# Altium footprint library 7-Connectors-7.PcbLib: 35 footprints (part 3 of 4) (continued)
## PANASONIC_AYF312315 [mm] "23 Contacts, Pitch 0.3mm, Surface Mount, FPC for FPC Connection, YF31 Serie" (continued)
Mechanical 14:
  lines w0.1: -4.125,-1.1 -4.125,-1.15 -3.825,-1.15 -3.825,-1.6 3.825,-1.6 3.825,-1.15 4.125,-1.15 4.125,-1.1 ; -4.075,-1.15 -4.075,-1.25 -3.925,-1.25 -3.925,-1.15 ; -3.91,-1.15 -3.91,-1.17 ; -3.91,-0.151 -3.825,-0.151 -3.825,-0.129 ; -3.91,-0.15 -3.825,-0.15 ; -3.91,-0.13 -3.825,-0.13 ; -3.91,-0.05 3.91,-0.05 ; -3.91,0.35 3.91,0.35 ; -3.825,-1.385 -3.91,-1.3 ; -3.825,-1.3 -3.91,-1.3 ; -3.825,-1.17 -3.91,-1.17 ; -3.825,-0.05 -3.825,-0.129 ; -3.36,-0.129 -3.825,-0.129 ; -3.36,-0.05 -3.36,-0.283 -3.24,-0.283 -3.24,-0.05 ; -3.24,-0.129 -3.06,-0.129 ; -3.06,-0.05 -3.06,-0.332 -2.94,-0.332 -2.94,-0.05 ; -2.94,-0.129 -2.76,-0.129 ; -2.76,-0.05 -2.76,-0.283 -2.64,-0.283 -2.64,-0.05 ; -2.64,-0.129 -2.46,-0.129 ; -2.46,-0.05 -2.46,-0.332 -2.34,-0.332 -2.34,-0.05 ; -2.34,-0.129 -2.16,-0.129 ; -2.16,-0.05 -2.16,-0.283 -2.04,-0.283 -2.04,-0.05 ; -2.04,-0.129 -1.86,-0.129 ; -1.86,-0.05 -1.86,-0.332 -1.74,-0.332 -1.74,-0.05 ; -1.74,-0.129 -1.56,-0.129 ; -1.56,-0.05 -1.56,-0.283 -1.44,-0.283 -1.44,-0.05 ; -1.44,-0.129 -1.26,-0.129 ; -1.26,-0.05 -1.26,-0.332 -1.14,-0.332 -1.14,-0.05 ; -1.14,-0.129 -0.96,-0.129 ; -0.96,-0.05 -0.96,-0.283 -0.84,-0.283 -0.84,-0.05 ; -0.84,-0.129 -0.66,-0.129 ; -0.66,-0.05 -0.66,-0.332 -0.54,-0.332 -0.54,-0.05 ; -0.54,-0.129 -0.36,-0.129 ; -0.36,-0.05 -0.36,-0.283 -0.24,-0.283 -0.24,-0.05 ; -0.24,-0.129 -0.06,-0.129 ; -0.06,-0.05 -0.06,-0.332 0.06,-0.332 0.06,-0.05 ; 0.06,-0.129 0.24,-0.129 ; 0.24,-0.05 0.24,-0.283 0.36,-0.283 0.36,-0.05 ; 0.36,-0.129 0.54,-0.129 ; 0.54,-0.05 0.54,-0.332 0.66,-0.332 0.66,-0.05 ; 0.66,-0.129 0.84,-0.129 ; 0.84,-0.05 0.84,-0.283 0.96,-0.283 0.96,-0.05 ; 0.96,-0.129 1.14,-0.129 ; 1.14,-0.05 1.14,-0.332 1.26,-0.332 1.26,-0.05 ; 1.26,-0.129 1.44,-0.129 ; 1.44,-0.05 1.44,-0.283 1.56,-0.283 1.56,-0.05 ; 1.56,-0.129 1.74,-0.129 ; 1.74,-0.05 1.74,-0.332 1.86,-0.332 1.86,-0.05 ; 1.86,-0.129 2.04,-0.129 ; 2.04,-0.05 2.04,-0.283 2.16,-0.283 2.16,-0.05 ; 2.16,-0.129 2.34,-0.129 ; 2.34,-0.05 2.34,-0.332 2.46,-0.332 2.46,-0.05 ; 2.46,-0.129 2.64,-0.129 ; 2.64,-0.05 2.64,-0.283 2.76,-0.283 2.76,-0.05 ; 2.76,-0.129 2.94,-0.129 ; 2.94,-0.05 2.94,-0.332 3.06,-0.332 3.06,-0.05 ; 3.06,-0.129 3.24,-0.129 ; 3.24,-0.05 3.24,-0.283 3.36,-0.283 3.36,-0.05 ; 3.36,-0.129 3.825,-0.129 ; 3.825,-1.385 3.91,-1.3 ; 3.825,-1.3 3.91,-1.3 ; 3.825,-1.17 3.91,-1.17 ; 3.825,-0.15 3.91,-0.15 ; 3.825,-0.13 3.91,-0.13 ; 3.825,-0.05 3.825,-0.129 ; 3.91,-1.15 3.91,-1.17 ; 3.91,-0.151 3.825,-0.151 3.825,-0.129 ; 3.925,-1.15 3.925,-1.25 4.075,-1.25 4.075,-1.15 ; -3.91,-1.3 -3.91,-1.17 ; 3.91,-1.3 3.91,-1.17 ; -4.475,-1.1 -4.475,1.6 4.475,1.6 4.475,-1.1 3.91,-1.1 3.91,0.38 -3.91,0.38 -3.91,-1.1 -4.475,-1.1
Mechanical 15:
  lines w0.05: -4.725,-1.85 -4.725,1.95 4.725,1.95 4.725,-1.85 -4.725,-1.85
3D body "p065-030.stp": height 0.02, standoff 0, extent 2.85,1.125 3.15,1.775
3D body "p065-030.stp": height 0.02, standoff 0, extent 2.25,1.125 2.55,1.775
3D body "p065-030.stp": height 0.02, standoff 0, extent 1.65,1.125 1.95,1.775
3D body "p065-030.stp": height 0.02, standoff 0, extent 1.05,1.125 1.35,1.775
3D body "p065-030.stp": height 0.02, standoff 0, extent 0.45,1.125 0.75,1.775
3D body "p065-030.stp": height 0.02, standoff 0, extent -0.15,1.125 0.15,1.775
3D body "p065-030.stp": height 0.02, standoff 0, extent -0.75,1.125 -0.45,1.775
3D body "p065-030.stp": height 0.02, standoff 0, extent -1.35,1.125 -1.05,1.775
3D body "p065-030.stp": height 0.02, standoff 0, extent -1.95,1.125 -1.65,1.775
3D body "p065-030.stp": height 0.02, standoff 0, extent -2.55,1.125 -2.25,1.775
3D body "p065-030.stp": height 0.02, standoff 0, extent -3.15,1.125 -2.85,1.775
3D body "p100-045.stp": height 0.02, standoff 0, extent 3.775,-1.4 4.225,-0.4
3D body "p100-045.stp": height 0.02, standoff 0, extent -4.225,-1.4 -3.775,-0.4
3D body "PANASONIC_AYF312315.stp": height 0.9, standoff 0, extent -4.475,-1.6 4.475,1.6

## PANASONIC_AYF312715 [mm] "27 Contacts, Pitch 0.3mm, Surface Mount, FPC for FPC Connection, YF31 Serie"
height 0.91
pads (29):
  rect 0.3x0.7 smd: 1(-3.9,-1.15) 3(-3.3,-1.15) 5(-2.7,-1.15) 7(-2.1,-1.15) 9(-1.5,-1.15) 11(-0.9,-1.15) 13(-0.3,-1.15) 15(0.3,-1.15) 17(0.9,-1.15) 19(1.5,-1.15) 21(2.1,-1.15) 23(2.7,-1.15) 25(3.3,-1.15) 27(3.9,-1.15)
  rect 0.3x0.5 smd: 2(-3.6,1.45) 4(-3,1.45) 6(-2.4,1.45) 8(-1.8,1.45) 10(-1.2,1.45) 12(-0.6,1.45) 14(0,1.45) 16(0.6,1.45) 18(1.2,1.45) 20(1.8,1.45) 22(2.4,1.45) 24(3,1.45) 26(3.6,1.45)
  rect 0.45x1 smd: 52(4.6,-0.9) 53(-4.6,-0.9)
Top Overlay:
  circle w0.25: c-3.9,-2.1 r0.125
  lines w0.2: -5.075,-0.05 -5.075,1.6 -4.15,1.6 ; -4.51,0.35 4.51,0.35 ; -4.425,-0.05 -4.425,-0.129 -3.96,-0.129 ; -3.96,-0.05 -3.96,-0.283 -3.84,-0.283 -3.84,-0.05 ; -3.84,-0.129 -3.66,-0.129 ; -3.66,-0.05 -3.66,-0.332 -3.54,-0.332 -3.54,-0.05 ; -3.36,-0.05 -3.36,-0.283 -3.24,-0.283 -3.24,-0.05 ; -3.24,-0.129 -3.06,-0.129 -3.225,-0.129 ; -3.06,-0.05 -3.06,-0.332 -2.94,-0.332 -2.94,-0.05 ; -2.94,-0.129 -2.76,-0.129 ; -2.76,-0.05 -2.76,-0.283 -2.64,-0.283 -2.64,-0.05 ; -2.64,-0.129 -2.46,-0.129 ; -2.46,-0.05 -2.46,-0.332 -2.34,-0.332 -2.34,-0.05 ; -2.34,-0.129 -2.16,-0.129 ; -2.16,-0.05 -2.16,-0.283 -2.04,-0.283 -2.04,-0.05 ; -2.04,-0.129 -1.86,-0.129 ; -1.86,-0.05 -1.86,-0.332 -1.74,-0.332 -1.74,-0.05 ; -1.74,-0.129 -1.56,-0.129 ; -1.56,-0.05 -1.56,-0.283 -1.44,-0.283 -1.44,-0.05 ; -1.44,-0.129 -1.26,-0.129 ; -1.26,-0.05 -1.26,-0.332 -1.14,-0.332 -1.14,-0.05 ; -1.14,-0.129 -0.96,-0.129 ; -0.96,-0.05 -0.96,-0.283 -0.84,-0.283 -0.84,-0.05 ; -0.84,-0.129 -0.66,-0.129 ; -0.66,-0.05 -0.66,-0.332 -0.54,-0.332 -0.54,-0.05 ; -0.54,-0.129 -0.36,-0.129 ; -0.36,-0.05 -0.36,-0.283 -0.24,-0.283 -0.24,-0.05 ; -0.24,-0.129 -0.06,-0.129 ; -0.06,-0.05 -0.06,-0.332 0.06,-0.332 0.06,-0.05 ; 0.06,-0.129 0.24,-0.129 ; 0.24,-0.05 0.24,-0.283 0.36,-0.283 0.36,-0.05 ; 0.36,-0.129 0.54,-0.129 ; 0.54,-0.05 0.54,-0.332 0.66,-0.332 0.66,-0.05 ; 0.66,-0.129 0.84,-0.129 ; 0.84,-0.05 0.84,-0.283 0.96,-0.283 0.96,-0.05 ; 0.96,-0.129 1.14,-0.129 ; 1.14,-0.05 1.14,-0.332 1.26,-0.332 1.26,-0.05 ; 1.26,-0.129 1.44,-0.129 ; 1.44,-0.05 1.44,-0.283 1.56,-0.283 1.56,-0.05 ; 1.56,-0.129 1.74,-0.129 ; 1.74,-0.05 1.74,-0.332 1.86,-0.332 1.86,-0.05 ; 1.86,-0.129 2.04,-0.129 ; 2.04,-0.05 2.04,-0.283 2.16,-0.283 2.16,-0.05 ; 2.16,-0.129 2.34,-0.129 ; 2.34,-0.05 2.34,-0.332 2.46,-0.332 2.46,-0.05 ; 2.46,-0.129 2.64,-0.129 ; 2.64,-0.05 2.64,-0.283 2.76,-0.283 2.76,-0.05 ; 2.76,-0.129 2.94,-0.129 ; 2.94,-0.05 2.94,-0.332 3.06,-0.332 3.06,-0.05 ; 3.06,-0.129 3.24,-0.129 ; 3.24,-0.05 3.24,-0.283 3.36,-0.283 3.36,-0.05 ; 3.36,-0.129 3.54,-0.129 ; 3.54,-0.05 3.54,-0.332 3.66,-0.332 3.66,-0.05 ; 3.66,-0.129 3.84,-0.129 ; 3.84,-0.05 3.84,-0.283 3.96,-0.283 3.96,-0.05 ; 3.96,-0.129 4.425,-0.129 4.425,-0.05 ; 4.15,1.6 5.075,1.6 5.075,-0.05 ; -4.51,-0.05 -4.51,0.38 4.51,0.38 4.51,-0.05 -4.51,-0.05
Mechanical 8:
  drawing of 151 lines, arcs and shapes, not listed
Mechanical 14:
  drawing of 154 lines, arcs and shapes, not listed
Mechanical 15:
  lines w0.05: -5.325,-1.85 5.325,-1.85 5.325,1.95 -5.325,1.95 -5.325,-1.85
3D body "p100-045.stp": height 0.02, standoff 0, extent 4.375,-1.4 4.825,-0.4
3D body "p100-045.stp": height 0.02, standoff 0, extent -4.825,-1.4 -4.375,-0.4
3D body "p065-030.stp": height 0.02, standoff 0, extent 3.45,1.125 3.75,1.775
3D body "p065-030.stp": height 0.02, standoff 0, extent 2.85,1.125 3.15,1.775
3D body "p065-030.stp": height 0.02, standoff 0, extent 2.25,1.125 2.55,1.775
3D body "p065-030.stp": height 0.02, standoff 0, extent 1.65,1.125 1.95,1.775
3D body "p065-030.stp": height 0.02, standoff 0, extent 1.05,1.125 1.35,1.775
3D body "p065-030.stp": height 0.02, standoff 0, extent 0.45,1.125 0.75,1.775
3D body "p065-030.stp": height 0.02, standoff 0, extent -0.15,1.125 0.15,1.775
3D body "p065-030.stp": height 0.02, standoff 0, extent -0.75,1.125 -0.45,1.775
3D body "p065-030.stp": height 0.02, standoff 0, extent -1.35,1.125 -1.05,1.775
3D body "p065-030.stp": height 0.02, standoff 0, extent -1.95,1.125 -1.65,1.775
3D body "p065-030.stp": height 0.02, standoff 0, extent -2.55,1.125 -2.25,1.775
3D body "p065-030.stp": height 0.02, standoff 0, extent -3.15,1.125 -2.85,1.775
3D body "p065-030.stp": height 0.02, standoff 0, extent -3.75,1.125 -3.45,1.775
3D body "PANASONIC_AYF312715.stp": height 0.9, standoff 0, extent -5.075,-1.6 5.075,1.6

## PANASONIC_AYF313315 [mm] "33 Contacts, Pitch 0.3mm, Surface Mount, FPC for FPC Connection, YF31 Serie"
height 0.91
pads (35):
  rect 0.3x0.7 smd: 1(-4.8,-1.15) 3(-4.2,-1.15) 5(-3.6,-1.15) 7(-3,-1.15) 9(-2.4,-1.15) 11(-1.8,-1.15) 13(-1.2,-1.15) 15(-0.6,-1.15) 17(0,-1.15) 19(0.6,-1.15) 21(1.2,-1.15) 23(1.8,-1.15) 25(2.4,-1.15) 27(3,-1.15) 29(3.6,-1.15) 31(4.2,-1.15) 33(4.8,-1.15)
  rect 0.3x0.5 smd: 2(-4.5,1.45) 4(-3.9,1.45) 6(-3.3,1.45) 8(-2.7,1.45) 10(-2.1,1.45) 12(-1.5,1.45) 14(-0.9,1.45) 16(-0.3,1.45) 18(0.3,1.45) 20(0.9,1.45) 22(1.5,1.45) 24(2.1,1.45) 26(2.7,1.45) 28(3.3,1.45) 30(3.9,1.45) 32(4.5,1.45)
  rect 0.45x1 smd: 34(5.5,-0.9) 35(-5.5,-0.9)
Top Overlay:
  circle w0.25: c-4.8,-2.1 r0.125
  lines w0.2: -5.975,-0.05 -5.975,1.6 -5.05,1.6 ; -5.41,0.35 5.41,0.35 ; -5.325,-0.05 -5.325,-0.129 -4.86,-0.129 ; -4.86,-0.05 -4.86,-0.283 -4.74,-0.283 -4.74,-0.05 ; -4.74,-0.129 -4.56,-0.129 ; -4.56,-0.05 -4.56,-0.332 -4.44,-0.332 -4.44,-0.05 ; -4.44,-0.129 -4.26,-0.129 ; -4.26,-0.05 -4.26,-0.283 -4.14,-0.283 -4.14,-0.05 ; -4.14,-0.129 -3.96,-0.129 ; -3.96,-0.05 -3.96,-0.332 -3.84,-0.332 -3.84,-0.05 ; -3.84,-0.129 -3.66,-0.129 ; -3.66,-0.05 -3.66,-0.283 -3.54,-0.283 -3.54,-0.05 ; -3.54,-0.129 -3.36,-0.129 ; -3.36,-0.05 -3.36,-0.332 -3.24,-0.332 -3.24,-0.05 ; -3.24,-0.129 -3.06,-0.129 ; -3.06,-0.05 -3.06,-0.283 -2.94,-0.283 -2.94,-0.05 ; -2.94,-0.129 -2.76,-0.129 ; -2.76,-0.05 -2.76,-0.332 -2.64,-0.332 -2.64,-0.05 ; -2.64,-0.129 -2.46,-0.129 ; -2.46,-0.05 -2.46,-0.283 -2.34,-0.283 -2.34,-0.05 ; -2.34,-0.129 -2.16,-0.129 ; -2.16,-0.05 -2.16,-0.332 -2.04,-0.332 -2.04,-0.05 ; -2.04,-0.129 -1.86,-0.129 ; -1.86,-0.05 -1.86,-0.283 -1.74,-0.283 -1.74,-0.05 ; -1.74,-0.129 -1.56,-0.129 ; -1.56,-0.05 -1.56,-0.332 -1.44,-0.332 -1.44,-0.05 ; -1.44,-0.129 -1.26,-0.129 ; -1.26,-0.05 -1.26,-0.283 -1.14,-0.283 -1.14,-0.05 ; -1.14,-0.129 -0.96,-0.129 ; -0.96,-0.05 -0.96,-0.332 -0.84,-0.332 -0.84,-0.05 ; -0.84,-0.129 -0.66,-0.129 ; -0.66,-0.05 -0.66,-0.283 -0.54,-0.283 -0.54,-0.05 ; -0.54,-0.129 -0.36,-0.129 ; -0.36,-0.05 -0.36,-0.332 -0.24,-0.332 -0.24,-0.05 ; -0.24,-0.129 -0.06,-0.129 ; -0.06,-0.05 -0.06,-0.283 0.06,-0.283 0.06,-0.05 ; 0.06,-0.129 0.24,-0.129 ; 0.24,-0.05 0.24,-0.332 0.36,-0.332 0.36,-0.05 ; 0.36,-0.129 0.54,-0.129 ; 0.54,-0.05 0.54,-0.283 0.66,-0.283 0.66,-0.05 ; 0.66,-0.129 0.84,-0.129 ; 0.84,-0.05 0.84,-0.332 0.96,-0.332 0.96,-0.05 ; 0.96,-0.129 1.14,-0.129 ; 1.14,-0.05 1.14,-0.283 1.26,-0.283 1.26,-0.05 ; 1.26,-0.129 1.44,-0.129 ; 1.44,-0.05 1.44,-0.332 1.56,-0.332 1.56,-0.05 ; 1.56,-0.129 1.74,-0.129 ; 1.74,-0.05 1.74,-0.283 1.86,-0.283 1.86,-0.05 ; 1.86,-0.129 2.04,-0.129 ; 2.04,-0.05 2.04,-0.332 2.16,-0.332 2.16,-0.05 ; 2.16,-0.129 2.34,-0.129 ; 2.34,-0.05 2.34,-0.283 2.46,-0.283 2.46,-0.05 ; 2.46,-0.129 2.64,-0.129 ; 2.64,-0.05 2.64,-0.332 2.76,-0.332 2.76,-0.05 ; 2.76,-0.129 2.94,-0.129 ; 2.94,-0.05 2.94,-0.283 3.06,-0.283 3.06,-0.05 ; 3.06,-0.129 3.24,-0.129 ; 3.24,-0.05 3.24,-0.332 3.36,-0.332 3.36,-0.05 ; 3.36,-0.129 3.54,-0.129 ; 3.54,-0.05 3.54,-0.283 3.66,-0.283 3.66,-0.05 ; 3.66,-0.129 3.84,-0.129 ; 3.84,-0.05 3.84,-0.332 3.96,-0.332 3.96,-0.05 ; 3.96,-0.129 4.14,-0.129 ; 4.14,-0.05 4.14,-0.283 4.26,-0.283 4.26,-0.05 ; 4.26,-0.129 4.44,-0.129 ; 4.44,-0.05 4.44,-0.332 4.56,-0.332 4.56,-0.05 ; 4.56,-0.129 4.74,-0.129 ; 4.74,-0.05 4.74,-0.283 4.86,-0.283 4.86,-0.05 ; 4.86,-0.129 5.325,-0.129 5.325,-0.05 ; 5.05,1.6 5.975,1.6 5.975,-0.05 ; -5.41,-0.05 5.41,-0.05 5.41,0.38 -5.41,0.38 -5.41,-0.05
Mechanical 8:
  drawing of 179 lines, arcs and shapes, not listed
Mechanical 14:
  drawing of 176 lines, arcs and shapes, not listed
Mechanical 15:
  lines w0.05: -6.225,-1.85 -6.225,1.95 6.225,1.95 6.225,-1.85 -6.225,-1.85
3D body "PANASONIC_AYF313315.stp": height 0.9, standoff 0, extent -5.975,-1.6 5.975,1.6
3D body "p065-030.stp": height 0.02, standoff 0, extent -4.65,1.125 -4.35,1.775
3D body "p065-030.stp": height 0.02, standoff 0, extent -4.05,1.125 -3.75,1.775
3D body "p065-030.stp": height 0.02, standoff 0, extent -3.45,1.125 -3.15,1.775
3D body "p065-030.stp": height 0.02, standoff 0, extent -2.85,1.125 -2.55,1.775
3D body "p065-030.stp": height 0.02, standoff 0, extent -2.25,1.125 -1.95,1.775
3D body "p065-030.stp": height 0.02, standoff 0, extent -1.65,1.125 -1.35,1.775
3D body "p065-030.stp": height 0.02, standoff 0, extent -1.05,1.125 -0.75,1.775
3D body "p065-030.stp": height 0.02, standoff 0, extent -0.45,1.125 -0.15,1.775
3D body "p065-030.stp": height 0.02, standoff 0, extent 0.15,1.125 0.45,1.775
3D body "p065-030.stp": height 0.02, standoff 0, extent 0.75,1.125 1.05,1.775
3D body "p065-030.stp": height 0.02, standoff 0, extent 1.35,1.125 1.65,1.775
3D body "p065-030.stp": height 0.02, standoff 0, extent 1.95,1.125 2.25,1.775
3D body "p065-030.stp": height 0.02, standoff 0, extent 2.55,1.125 2.85,1.775
3D body "p065-030.stp": height 0.02, standoff 0, extent 3.15,1.125 3.45,1.775
3D body "p065-030.stp": height 0.02, standoff 0, extent 3.75,1.125 4.05,1.775
3D body "p065-030.stp": height 0.02, standoff 0, extent 4.35,1.125 4.65,1.775
3D body "p100-045.stp": height 0.02, standoff 0, extent -5.725,-1.4 -5.275,-0.4
3D body "p100-045.stp": height 0.02, standoff 0, extent 5.275,-1.4 5.725,-0.4

## PANASONIC_AYF314115 [mm] "41 Contacts, Pitch 0.3mm, Surface Mount, FPC for FPC Connection, YF31 Serie"
height 0.91
pads (43):
  rect 0.3x0.7 smd: 1(-6,-1.15) 3(-5.4,-1.15) 5(-4.8,-1.15) 7(-4.2,-1.15) 9(-3.6,-1.15) 11(-3,-1.15) 13(-2.4,-1.15) 15(-1.8,-1.15) 17(-1.2,-1.15) 19(-0.6,-1.15) 21(0,-1.15) 23(0.6,-1.15) 25(1.2,-1.15) 27(1.8,-1.15) 29(2.4,-1.15) 31(3,-1.15) 33(3.6,-1.15) 35(4.2,-1.15) 37(4.8,-1.15) 39(5.4,-1.15) 41(6,-1.15)
  rect 0.3x0.5 smd: 2(-5.7,1.45) 4(-5.1,1.45) 6(-4.5,1.45) 8(-3.9,1.45) 10(-3.3,1.45) 12(-2.7,1.45) 14(-2.1,1.45) 16(-1.5,1.45) 18(-0.9,1.45) 20(-0.3,1.45) 22(0.3,1.45) 24(0.9,1.45) 26(1.5,1.45) 28(2.1,1.45) 30(2.7,1.45) 32(3.3,1.45) 34(3.9,1.45) 36(4.5,1.45) 38(5.1,1.45) 40(5.7,1.45)
  rect 0.45x1 smd: 42(6.7,-0.9) 43(-6.7,-0.9)
Top Overlay:
  drawing of 177 lines, arcs and shapes, not listed
Mechanical 8:
  drawing of 219 lines, arcs and shapes, not listed
Mechanical 14:
  drawing of 210 lines, arcs and shapes, not listed
Mechanical 15:
  lines w0.05: -7.425,-1.85 7.425,-1.85 7.425,1.95 -7.425,1.95 -7.425,-1.85
3D body "p100-045.stp": height 0.02, standoff 0, extent -6.925,-1.4 -6.475,-0.4
3D body "p100-045.stp": height 0.02, standoff 0, extent 6.475,-1.4 6.925,-0.4
3D body "p065-030.stp": height 0.02, standoff 0, extent 5.55,1.125 5.85,1.775
3D body "p065-030.stp": height 0.02, standoff 0, extent 4.95,1.125 5.25,1.775
3D body "p065-030.stp": height 0.02, standoff 0, extent 4.35,1.125 4.65,1.775
3D body "p065-030.stp": height 0.02, standoff 0, extent 3.75,1.125 4.05,1.775
3D body "p065-030.stp": height 0.02, standoff 0, extent 3.15,1.125 3.45,1.775
3D body "p065-030.stp": height 0.02, standoff 0, extent 2.55,1.125 2.85,1.775
3D body "p065-030.stp": height 0.02, standoff 0, extent 1.95,1.125 2.25,1.775
3D body "p065-030.stp": height 0.02, standoff 0, extent 1.35,1.125 1.65,1.775
3D body "p065-030.stp": height 0.02, standoff 0, extent 0.75,1.125 1.05,1.775
3D body "p065-030.stp": height 0.02, standoff 0, extent 0.15,1.125 0.45,1.775
3D body "p065-030.stp": height 0.02, standoff 0, extent -0.45,1.125 -0.15,1.775
3D body "p065-030.stp": height 0.02, standoff 0, extent -1.05,1.125 -0.75,1.775
3D body "p065-030.stp": height 0.02, standoff 0, extent -1.65,1.125 -1.35,1.775
3D body "p065-030.stp": height 0.02, standoff 0, extent -2.25,1.125 -1.95,1.775
3D body "p065-030.stp": height 0.02, standoff 0, extent -2.85,1.125 -2.55,1.775
3D body "p065-030.stp": height 0.02, standoff 0, extent -3.45,1.125 -3.15,1.775
3D body "p065-030.stp": height 0.02, standoff 0, extent -4.05,1.125 -3.75,1.775
3D body "p065-030.stp": height 0.02, standoff 0, extent -4.65,1.125 -4.35,1.775
3D body "p065-030.stp": height 0.02, standoff 0, extent -5.25,1.125 -4.95,1.775
3D body "p065-030.stp": height 0.02, standoff 0, extent -5.85,1.125 -5.55,1.775
3D body "PANASONIC_AYF314115.stp": height 0.9, standoff 0, extent -7.175,-1.6 7.175,1.6

## PANASONIC_AYF315115 [mm] "51 Contacts, Pitch 0.3mm, Surface Mount, FPC for FPC Connection, YF31 Serie"
height 0.91
pads (53):
  rect 0.3x0.7 smd: 1(-7.5,-1.15) 3(-6.9,-1.15) 5(-6.3,-1.15) 7(-5.7,-1.15) 9(-5.1,-1.15) 11(-4.5,-1.15) 13(-3.9,-1.15) 15(-3.3,-1.15) 17(-2.7,-1.15) 19(-2.1,-1.15) 21(-1.5,-1.15) 23(-0.9,-1.15) 25(-0.3,-1.15) 27(0.3,-1.15) 29(0.9,-1.15) 31(1.5,-1.15) 33(2.1,-1.15) 35(2.7,-1.15) 37(3.3,-1.15) 39(3.9,-1.15) 41(4.5,-1.15) 43(5.1,-1.15) 45(5.7,-1.15) 47(6.3,-1.15) 49(6.9,-1.15) 51(7.5,-1.15)
  rect 0.3x0.5 smd: 2(-7.2,1.45) 4(-6.6,1.45) 6(-6,1.45) 8(-5.4,1.45) 10(-4.8,1.45) 12(-4.2,1.45) 14(-3.6,1.45) 16(-3,1.45) 18(-2.4,1.45) 20(-1.8,1.45) 22(-1.2,1.45) 24(-0.6,1.45) 26(0,1.45) 28(0.6,1.45) 30(1.2,1.45) 32(1.8,1.45) 34(2.4,1.45) 36(3,1.45) 38(3.6,1.45) 40(4.2,1.45) 42(4.8,1.45) 44(5.4,1.45) 46(6,1.45) 48(6.6,1.45) 50(7.2,1.45)
  rect 0.45x1 smd: 52(8.2,-0.9) 53(-8.2,-0.9)
Top Overlay:
  drawing of 215 lines, arcs and shapes, not listed
Mechanical 8:
  drawing of 269 lines, arcs and shapes, not listed
Mechanical 14:
  drawing of 250 lines, arcs and shapes, not listed
Mechanical 15:
  lines w0.05: -8.925,-1.85 -8.925,1.95 8.925,1.95 8.925,-1.85 -8.925,-1.85
3D body "PANASONIC_AYF315115.stp": height 0.9, standoff 0, extent -8.675,-1.6 8.675,1.6
3D body "p065-030.stp": height 0.02, standoff 0, extent -7.35,1.125 -7.05,1.775
3D body "p065-030.stp": height 0.02, standoff 0, extent -6.75,1.125 -6.45,1.775
3D body "p065-030.stp": height 0.02, standoff 0, extent -6.15,1.125 -5.85,1.775
3D body "p065-030.stp": height 0.02, standoff 0, extent -5.55,1.125 -5.25,1.775
3D body "p065-030.stp": height 0.02, standoff 0, extent -4.95,1.125 -4.65,1.775
3D body "p065-030.stp": height 0.02, standoff 0, extent -4.35,1.125 -4.05,1.775
3D body "p065-030.stp": height 0.02, standoff 0, extent -3.75,1.125 -3.45,1.775
3D body "p065-030.stp": height 0.02, standoff 0, extent -3.15,1.125 -2.85,1.775
3D body "p065-030.stp": height 0.02, standoff 0, extent -2.55,1.125 -2.25,1.775
3D body "p065-030.stp": height 0.02, standoff 0, extent -1.95,1.125 -1.65,1.775
3D body "p065-030.stp": height 0.02, standoff 0, extent -1.35,1.125 -1.05,1.775
3D body "p065-030.stp": height 0.02, standoff 0, extent -0.75,1.125 -0.45,1.775
3D body "p065-030.stp": height 0.02, standoff 0, extent -0.15,1.125 0.15,1.775
3D body "p065-030.stp": height 0.02, standoff 0, extent 0.45,1.125 0.75,1.775
3D body "p065-030.stp": height 0.02, standoff 0, extent 1.05,1.125 1.35,1.775
3D body "p065-030.stp": height 0.02, standoff 0, extent 1.65,1.125 1.95,1.775
3D body "p065-030.stp": height 0.02, standoff 0, extent 2.25,1.125 2.55,1.775
3D body "p065-030.stp": height 0.02, standoff 0, extent 2.85,1.125 3.15,1.775
3D body "p065-030.stp": height 0.02, standoff 0, extent 3.45,1.125 3.75,1.775
3D body "p065-030.stp": height 0.02, standoff 0, extent 4.05,1.125 4.35,1.775
3D body "p065-030.stp": height 0.02, standoff 0, extent 4.65,1.125 4.95,1.775
3D body "p065-030.stp": height 0.02, standoff 0, extent 5.25,1.125 5.55,1.775
3D body "p065-030.stp": height 0.02, standoff 0, extent 5.85,1.125 6.15,1.775
3D body "p065-030.stp": height 0.02, standoff 0, extent 6.45,1.125 6.75,1.775
3D body "p065-030.stp": height 0.02, standoff 0, extent 7.05,1.125 7.35,1.775
3D body "p100-045.stp": height 0.02, standoff 0, extent -8.425,-1.4 -7.975,-0.4
3D body "p100-045.stp": height 0.02, standoff 0, extent 7.975,-1.4 8.425,-0.4

## PB [mm]
Top Overlay:
  circle w0.5: c-0.031,0.013 r2.5
  lines w0.5: -1.737,1.719 1.675,-1.693
  text "Pb" at -1.536,-0.948 h3.05
3D body "pb.stp": height 0.02, standoff 0, extent -2.725,-2.725 2.725,2.725

## SAMTEC_ASP-127797-01 [mm] "Connector VITA 57, 160 Male contacts in 4 row cdgh"
height 6.1
pads (162):
  round 1 hole 1.3 unplated mask+0.3: 1(-27.191,-3.048) 2(27.191,0)
  round 0.64 smd: c1(24.765,3.175) c2(23.495,3.175) c3(22.225,3.175) c4(20.955,3.175) c5(19.685,3.175) c6(18.415,3.175) c7(17.145,3.175) c8(15.875,3.175) c9(14.605,3.175) c10(13.335,3.175) c11(12.065,3.175) c12(10.795,3.175) c13(9.525,3.175) c14(8.255,3.175) c15(6.985,3.175) c16(5.715,3.175) c17(4.445,3.175) c18(3.175,3.175) c19(1.905,3.175) c20(0.635,3.175) c21(-0.635,3.175) c22(-1.905,3.175) c23(-3.175,3.175) c24(-4.445,3.175) c25(-5.715,3.175) c26(-6.985,3.175) c27(-8.255,3.175) c28(-9.525,3.175) c29(-10.795,3.175) c30(-12.065,3.175) c31(-13.335,3.175) c32(-14.605,3.175) c33(-15.875,3.175) c34(-17.145,3.175) c35(-18.415,3.175) c36(-19.685,3.175) c37(-20.955,3.175) c38(-22.225,3.175) c39(-23.495,3.175) c40(-24.765,3.175) d1(24.765,1.905) d2(23.495,1.905) d3(22.225,1.905) d4(20.955,1.905) d5(19.685,1.905) d6(18.415,1.905) d7(17.145,1.905) d8(15.875,1.905) d9(14.605,1.905) d10(13.335,1.905) d11(12.065,1.905) d12(10.795,1.905) d13(9.525,1.905) d14(8.255,1.905) d15(6.985,1.905) d16(5.715,1.905) d17(4.445,1.905) d18(3.175,1.905) d19(1.905,1.905) d20(0.635,1.905) d21(-0.635,1.905) d22(-1.905,1.905) d23(-3.175,1.905) d24(-4.445,1.905) d25(-5.715,1.905) d26(-6.985,1.905) d27(-8.255,1.905) d28(-9.525,1.905) d29(-10.795,1.905) d30(-12.065,1.905) d31(-13.335,1.905) d32(-14.605,1.905) d33(-15.875,1.905) d34(-17.145,1.905) d35(-18.415,1.905) d36(-19.685,1.905) d37(-20.955,1.905) d38(-22.225,1.905) d39(-23.495,1.905) d40(-24.765,1.905) g1(24.765,-1.905) g2(23.495,-1.905) g3(22.225,-1.905) g4(20.955,-1.905) g5(19.685,-1.905) g6(18.415,-1.905) g7(17.145,-1.905) g8(15.875,-1.905) g9(14.605,-1.905) g10(13.335,-1.905) g11(12.065,-1.905) g12(10.795,-1.905) g13(9.525,-1.905) g14(8.255,-1.905) g15(6.985,-1.905) g16(5.715,-1.905) g17(4.445,-1.905) g18(3.175,-1.905) g19(1.905,-1.905) g20(0.635,-1.905) g21(-0.635,-1.905) g22(-1.905,-1.905) g23(-3.175,-1.905) g24(-4.445,-1.905) g25(-5.715,-1.905) g26(-6.985,-1.905) g27(-8.255,-1.905) g28(-9.525,-1.905) g29(-10.795,-1.905) g30(-12.065,-1.905) g31(-13.335,-1.905) g32(-14.605,-1.905) g33(-15.875,-1.905) g34(-17.145,-1.905) g35(-18.415,-1.905) g36(-19.685,-1.905) g37(-20.955,-1.905) g38(-22.225,-1.905) g39(-23.495,-1.905) g40(-24.765,-1.905) h1(24.765,-3.175) h2(23.495,-3.175) h3(22.225,-3.175) h4(20.955,-3.175) h5(19.685,-3.175) h6(18.415,-3.175) h7(17.145,-3.175) h8(15.875,-3.175) h9(14.605,-3.175) h10(13.335,-3.175) h11(12.065,-3.175) h12(10.795,-3.175) h13(9.525,-3.175) h14(8.255,-3.175) h15(6.985,-3.175) h16(5.715,-3.175) h17(4.445,-3.175) h18(3.175,-3.175) h19(1.905,-3.175) h20(0.635,-3.175) h21(-0.635,-3.175) h22(-1.905,-3.175) h23(-3.175,-3.175) h24(-4.445,-3.175) h25(-5.715,-3.175) h26(-6.985,-3.175) h27(-8.255,-3.175) h28(-9.525,-3.175) h29(-10.795,-3.175) h30(-12.065,-3.175) h31(-13.335,-3.175) h32(-14.605,-3.175) h33(-15.875,-3.175) h34(-17.145,-3.175) h35(-18.415,-3.175) h36(-19.685,-3.175) h37(-20.955,-3.175) h38(-22.225,-3.175) h39(-23.495,-3.175) h40(-24.765,-3.175)
Top Overlay:
  drawing of 605 lines, arcs and shapes, not listed
  text "d" at 29.989,1.545 h1
  text "c" at 29.972,2.921 h1
  text "h" at 29.972,-3.556 h1
  text "g" at 29.862,-2.231 h1
  text "40" at -27.305,-7.112 h1
  text "1" at 25.417,-8.073 h1
Mechanical 8:
  drawing of 648 lines, arcs and shapes, not listed
Mechanical 14:
  drawing of 4433 lines, arcs and shapes, not listed
  text "c" at 29.972,2.921 h1
  text "d" at 29.989,1.545 h1
  text "h" at 29.972,-3.556 h1
  text "g" at 29.862,-2.231 h1
  text "40" at -27.305,-7.112 h1
  text "1" at 25.417,-8.073 h1
3D body "SAMTEC_ASP-127797-01.stp": height 5.61, standoff -1.27, extent -27.889,-7.341 28.778,7.341